# Altium footprint library Espressif.PcbLib: 5 footprints
Each footprint in its own frame and in the unit in brackets; x right, y up, seen from the top. Pads: shape width x height; smd on the part's side, far side on the other; paste and mask are expansions set on the pad; w line width, h text height; cw(c..) or ccw(c..) is an arc to the next point about the centre after c.
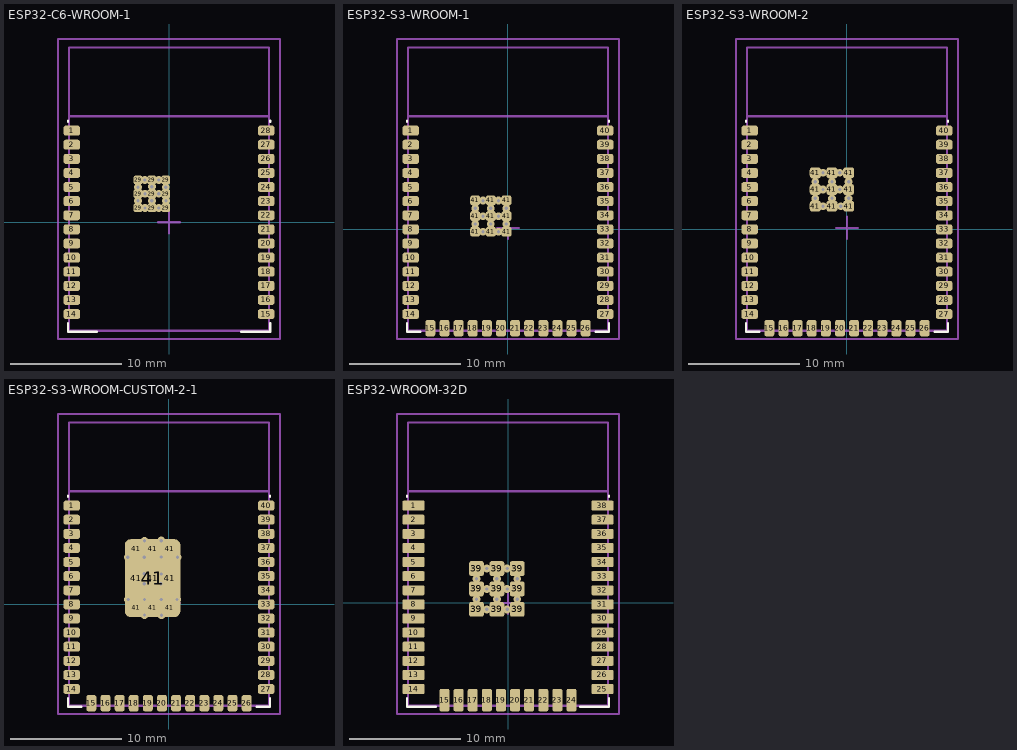
[diagram p0: the footprints below, top view; thin cyan lines are the x and y axes]

## ESP32-C6-WROOM-1 [mm] "ESP32-C6-WROOM-1 SoC"
height 3.1
pads (37):
  rrect50% 1.5x0.9 smd: 1(-8.75,8.255) 2(-8.75,6.985) 3(-8.75,5.715) 4(-8.75,4.445) 5(-8.75,3.175) 6(-8.75,1.905) 7(-8.75,0.635) 8(-8.75,-0.635) 9(-8.75,-1.905) 10(-8.75,-3.175) 11(-8.75,-4.445) 12(-8.75,-5.715) 13(-8.75,-6.985) 14(-8.75,-8.255) 15(8.75,-8.255) 16(8.75,-6.985) 17(8.75,-5.715) 18(8.75,-4.445) 19(8.75,-3.175) 20(8.75,-1.905) 21(8.75,-0.635) 22(8.75,0.635) 23(8.75,1.905) 24(8.75,3.175) 25(8.75,4.445) 26(8.75,5.715) 27(8.75,6.985) 28(8.75,8.255)
  rrect50% 0.8x0.8 smd: 29(-2.79,1.315) 29(-2.79,2.565) 29(-2.79,3.815) 29(-1.54,1.315) 29(-1.54,2.565) 29(-1.54,3.815) 29(-0.29,1.315) 29(-0.29,2.565) 29(-0.29,3.815)
via -2.19,3.815 diameter 0.7 hole 0.3
via -1.54,3.215 diameter 0.7 hole 0.3
via -0.915,3.815 diameter 0.7 hole 0.3
via -0.29,3.165 diameter 0.7 hole 0.3
via -0.915,2.565 diameter 0.7 hole 0.3
via -2.165,2.565 diameter 0.7 hole 0.3
via -2.79,3.165 diameter 0.7 hole 0.3
via -2.79,1.94 diameter 0.7 hole 0.3
via -1.54,1.94 diameter 0.7 hole 0.3
via -0.915,1.29 diameter 0.7 hole 0.3
via -2.165,1.29 diameter 0.7 hole 0.3
via -0.265,1.94 diameter 0.7 hole 0.3
Top Overlay:
  lines w0.2: -9.096,-9.055 -9.096,-9.855 -6.496,-9.855 ; -9.096,9.02 -9.096,9.145 ; 6.504,-9.855 9.104,-9.855 9.104,-9.055 ; 9.104,9.02 9.104,9.145
3D Top:
  lines w0.2: -8.996,9.545 9.004,9.545 ; -8.996,-9.755 9.004,-9.755 9.004,15.745 -8.996,15.745 -8.996,-9.755
  text "PCB Edge" at -8.596,9.945 h0.8
Courtyard Top:
  lines w0.2: -1,0 1,0 ; 0,-1 0,1 ; -10,-10.5 -10,16.5 10,16.5 10,-10.5 -10,-10.5
3D body: height 3.16, standoff 0, extent -8.996,-9.755 9.004,15.745

## ESP32-S3-WROOM-1 [mm] "ESP32-S3-WROOM-1 SoC"
height 3.1
pads (49):
  rrect50% 1.5x0.9 smd: 1(-8.75,8.89) 2(-8.75,7.62) 3(-8.75,6.35) 4(-8.75,5.08) 5(-8.75,3.81) 6(-8.75,2.54) 7(-8.75,1.27) 8(-8.75,0) 9(-8.75,-1.27) 10(-8.75,-2.54) 11(-8.75,-3.81) 12(-8.75,-5.08) 13(-8.75,-6.35) 14(-8.75,-7.62) 27(8.75,-7.62) 28(8.75,-6.35) 29(8.75,-5.08) 30(8.75,-3.81) 31(8.75,-2.54) 32(8.75,-1.27) 33(8.75,0) 34(8.75,1.27) 35(8.75,2.54) 36(8.75,3.81) 37(8.75,5.08) 38(8.75,6.35) 39(8.75,7.62) 40(8.75,8.89)
  rrect50% 0.9x1.5 smd: 15(-6.98,-8.89) 16(-5.71,-8.89) 17(-4.44,-8.89) 18(-3.17,-8.89) 19(-1.9,-8.89) 20(-0.63,-8.89) 21(0.64,-8.89) 22(1.91,-8.89) 23(3.18,-8.89) 24(4.45,-8.89) 25(5.72,-8.89) 26(6.99,-8.89)
  rrect50% 0.9x0.9 smd: 41(-2.95,-0.21) 41(-2.95,1.2) 41(-2.95,2.61) 41(-1.54,-0.21) 41(-1.54,1.2) 41(-1.54,2.61) 41(-0.13,-0.21) 41(-0.13,1.2) 41(-0.13,2.61)
via -2.25,-0.21 diameter 0.7 hole 0.3
via -0.15,0.49 diameter 0.7 hole 0.3
via -0.85,-0.21 diameter 0.7 hole 0.3
via -0.85,1.19 diameter 0.7 hole 0.3
via -2.25,1.19 diameter 0.7 hole 0.3
via -0.85,2.59 diameter 0.7 hole 0.3
via -1.55,1.89 diameter 0.7 hole 0.3
via -2.25,2.59 diameter 0.7 hole 0.3
via -2.95,1.89 diameter 0.7 hole 0.3
via -1.55,0.49 diameter 0.7 hole 0.3
via -2.95,0.49 diameter 0.7 hole 0.3
via -0.15,1.89 diameter 0.7 hole 0.3
Top Overlay:
  lines w0.2: -9.096,-8.42 -9.096,-9.22 -7.9,-9.22 ; -9.096,9.655 -9.096,9.78 ; 7.9,-9.22 9.104,-9.22 9.104,-8.42 ; 9.104,9.655 9.104,9.78
3D Top:
  lines w0.2: -8.996,10.18 9.004,10.18 ; -8.996,-9.12 -8.996,16.38 9.004,16.38 9.004,-9.12 -8.996,-9.12
  text "PCB Edge" at -8.596,10.58 h0.8
Courtyard Top:
  lines w0.2: -0.996,0.135 1.004,0.135 ; 0.004,-0.865 0.004,1.135 ; -9.996,-9.865 10.004,-9.865 10.004,17.135 -9.996,17.135 -9.996,-9.865
3D body: height 3.11, standoff -0.05, extent -9.01,-9.1 9.01,16.41

## ESP32-S3-WROOM-2 [mm] "ESP32-S3-WROOM-2 SoC"
height 3.1
pads (49):
  rrect50% 1.5x0.9 smd: 1(-8.75,8.89) 2(-8.75,7.62) 3(-8.75,6.35) 4(-8.75,5.08) 5(-8.75,3.81) 6(-8.75,2.54) 7(-8.75,1.27) 8(-8.75,0) 9(-8.75,-1.27) 10(-8.75,-2.54) 11(-8.75,-3.81) 12(-8.75,-5.08) 13(-8.75,-6.35) 14(-8.75,-7.62) 27(8.75,-7.62) 28(8.75,-6.35) 29(8.75,-5.08) 30(8.75,-3.81) 31(8.75,-2.54) 32(8.75,-1.27) 33(8.75,0) 34(8.75,1.27) 35(8.75,2.54) 36(8.75,3.81) 37(8.75,5.08) 38(8.75,6.35) 39(8.75,7.62) 40(8.75,8.89)
  rrect50% 0.9x1.5 smd: 15(-6.98,-8.89) 16(-5.71,-8.89) 17(-4.44,-8.89) 18(-3.17,-8.89) 19(-1.9,-8.89) 20(-0.63,-8.89) 21(0.64,-8.89) 22(1.91,-8.89) 23(3.18,-8.89) 24(4.45,-8.89) 25(5.72,-8.89) 26(6.99,-8.89)
  rrect50% 1x1 smd: 41(-2.85,2.09) 41(-2.85,3.59) 41(-2.85,5.09) 41(-1.35,2.09) 41(-1.35,3.59) 41(-1.35,5.09) 41(0.15,2.09) 41(0.15,3.59) 41(0.15,5.09)
via -2.85,2.79 diameter 0.7 hole 0.3
via -1.35,2.79 diameter 0.7 hole 0.3
via 0.15,2.79 diameter 0.7 hole 0.3
via -2.15,3.59 diameter 0.7 hole 0.3
via -2.85,4.29 diameter 0.7 hole 0.3
via 0.15,4.29 diameter 0.7 hole 0.3
via -0.65,5.09 diameter 0.7 hole 0.3
via -2.15,5.09 diameter 0.7 hole 0.3
via -1.35,4.29 diameter 0.7 hole 0.3
via -0.65,3.59 diameter 0.7 hole 0.3
via -2.15,2.09 diameter 0.7 hole 0.3
via -0.55,2.09 diameter 0.7 hole 0.3
Top Overlay:
  lines w0.2: -9.096,-8.42 -9.096,-9.22 -7.9,-9.22 ; -9.096,9.655 -9.096,9.78 ; 7.9,-9.22 9.104,-9.22 9.104,-8.42 ; 9.104,9.655 9.104,9.78
3D Top:
  lines w0.2: -8.996,10.18 9.004,10.18 ; -8.996,-9.12 9.004,-9.12 9.004,16.38 -8.996,16.38 -8.996,-9.12
  text "PCB Edge" at -8.596,10.58 h0.8
Courtyard Top:
  lines w0.2: -0.996,0.135 1.004,0.135 ; 0.004,-0.865 0.004,1.135 ; -9.996,-9.865 -9.996,17.135 10.004,17.135 10.004,-9.865 -9.996,-9.865
3D body: height 2.91, standoff -0.01, extent -8.996,-9.115 9.004,16.385

## ESP32-S3-WROOM-CUSTOM-2-1 [mm] "ESP32-S3-WROOM SoC"
height 3.1
pads (50):
  rrect50% 1.5x0.9 smd: 1(-8.75,8.89) 2(-8.75,7.62) 3(-8.75,6.35) 4(-8.75,5.08) 5(-8.75,3.81) 6(-8.75,2.54) 7(-8.75,1.27) 8(-8.75,0) 9(-8.75,-1.27) 10(-8.75,-2.54) 11(-8.75,-3.81) 12(-8.75,-5.08) 13(-8.75,-6.35) 14(-8.75,-7.62) 27(8.75,-7.62) 28(8.75,-6.35) 29(8.75,-5.08) 30(8.75,-3.81) 31(8.75,-2.54) 32(8.75,-1.27) 33(8.75,0) 34(8.75,1.27) 35(8.75,2.54) 36(8.75,3.81) 37(8.75,5.08) 38(8.75,6.35) 39(8.75,7.62) 40(8.75,8.89)
  rrect50% 0.9x1.5 smd: 15(-6.98,-8.89) 16(-5.71,-8.89) 17(-4.44,-8.89) 18(-3.17,-8.89) 19(-1.9,-8.89) 20(-0.63,-8.89) 21(0.64,-8.89) 22(1.91,-8.89) 23(3.18,-8.89) 24(4.45,-8.89) 25(5.72,-8.89) 26(6.99,-8.89)
  rrect50% 0.9x0.9 smd: 41(-2.95,-0.31) 41(-1.45,-0.31) 41(0.05,-0.31)
  rrect50% 1x3.25 smd: 41(-2.95,2.365) 41(-1.475,2.365) 41(0.05,2.365)
  rrect50% 1x1 smd: 41(-2.95,4.99) 41(-1.45,4.99) 41(0.05,4.99)
  rrect20% 5x7 smd paste-5: 41(-1.475,2.365)
via -3.7,4.24 diameter 0.7 hole 0.3
via -2.2,-0.96 diameter 0.7 hole 0.3
via -0.675,-0.985 diameter 0.7 hole 0.3
via 0.725,0.44 diameter 0.7 hole 0.3
via -3.675,0.44 diameter 0.7 hole 0.3
via -2.2,0.44 diameter 0.7 hole 0.3
via -0.7,0.44 diameter 0.7 hole 0.3
via -0.7,2.74 diameter 0.7 hole 0.3
via -2.225,2.765 diameter 0.7 hole 0.3
via -2.225,4.24 diameter 0.7 hole 0.3
via 0.775,4.24 diameter 0.7 hole 0.3
via -0.7,5.74 diameter 0.7 hole 0.3
via -2.2,5.715 diameter 0.7 hole 0.3
via -0.7,4.265 diameter 0.7 hole 0.3
via -2.225,1.865 diameter 0.7 hole 0.3
via -0.725,1.865 diameter 0.7 hole 0.3
Top Overlay:
  lines w0.2: -9.096,-8.42 -9.096,-9.22 -7.9,-9.22 ; -9.096,9.655 -9.096,9.78 ; 7.9,-9.22 9.104,-9.22 9.104,-8.42 ; 9.104,9.655 9.104,9.78
3D Top:
  lines w0.2: -8.996,10.18 9.004,10.18 ; -8.996,-9.12 9.004,-9.12 9.004,16.38 -8.996,16.38 -8.996,-9.12
  text "PCB Edge" at -8.596,10.58 h0.8
Courtyard Top:
  lines w0.2: -0.996,0.135 1.004,0.135 ; 0.004,-0.865 0.004,1.135 ; -9.996,-9.865 -9.996,17.135 10.004,17.135 10.004,-9.865 -9.996,-9.865
3D body: height 2.91, standoff -0.01, extent -8.996,-9.115 9.004,16.385

## ESP32-WROOM-32D [mm] "ESP32-WROOM-32 with PCB antenna"
height 3.2
pads (47):
  rrect30% 2x0.9 smd: 1(-8.5,8.755) 2(-8.5,7.485) 3(-8.5,6.215) 4(-8.5,4.945) 5(-8.5,3.675) 6(-8.5,2.405) 7(-8.5,1.135) 8(-8.5,-0.135) 9(-8.5,-1.405) 10(-8.5,-2.675) 11(-8.5,-3.945) 12(-8.5,-5.215) 13(-8.5,-6.485) 14(-8.5,-7.755) 25(8.5,-7.755) 26(8.5,-6.485) 27(8.5,-5.215) 28(8.5,-3.945) 29(8.5,-2.675) 30(8.5,-1.405) 31(8.5,-0.135) 32(8.5,1.135) 33(8.5,2.405) 34(8.5,3.675) 35(8.5,4.945) 36(8.5,6.215) 37(8.5,7.485) 38(8.5,8.755)
  rrect30% 0.9x2 smd: 15(-5.715,-8.755) 16(-4.445,-8.755) 17(-3.175,-8.755) 18(-1.905,-8.755) 19(-0.635,-8.755) 20(0.635,-8.755) 21(1.905,-8.755) 22(3.175,-8.755) 23(4.445,-8.755) 24(5.715,-8.755)
  rrect30% 1.33x1.33 smd: 39(-2.835,-0.58) 39(-2.835,1.255) 39(-2.835,3.09) 39(-1,-0.58) 39(-1,1.255) 39(-1,3.09) 39(0.835,-0.58) 39(0.835,1.255) 39(0.835,3.09)
via -1.92,3.095 diameter 0.7 hole 0.3
via -2.84,2.175 diameter 0.7 hole 0.3
via -1,2.175 diameter 0.7 hole 0.3
via -0.08,3.095 diameter 0.7 hole 0.3
via 0.84,2.175 diameter 0.7 hole 0.3
via 0.84,0.335 diameter 0.7 hole 0.3
via -0.08,-0.585 diameter 0.7 hole 0.3
via -1.92,-0.585 diameter 0.7 hole 0.3
via -2.84,0.335 diameter 0.7 hole 0.3
via -1,0.335 diameter 0.7 hole 0.3
via -0.08,1.255 diameter 0.7 hole 0.3
via -1.92,1.255 diameter 0.7 hole 0.3
Top Overlay:
  lines w0.2: -9.1,-8.555 -9.1,-9.355 -6.5,-9.355 ; -9.1,9.52 -9.1,9.645 ; 6.5,-9.355 9.1,-9.355 9.1,-8.555 ; 9.1,9.52 9.1,9.645
3D Top:
  lines w0.2: -9,10.045 9,10.045 ; -9,-9.255 9,-9.255 9,16.245 -9,16.245 -9,-9.255
  text "PCB Edge" at -8.6,10.445 h0.8
Courtyard Top:
  lines w0.2: -1,0 1,0 ; 0,-1 0,1 ; -10,-10 -10,17 10,17 10,-10 -10,-10
3D body: height 2.91, standoff -0.01, extent -9,-9.25 9,16.25